# Altium schematic symbol library IC_ADI.SCHLIB: 3169 symbols (part 137 of 181)
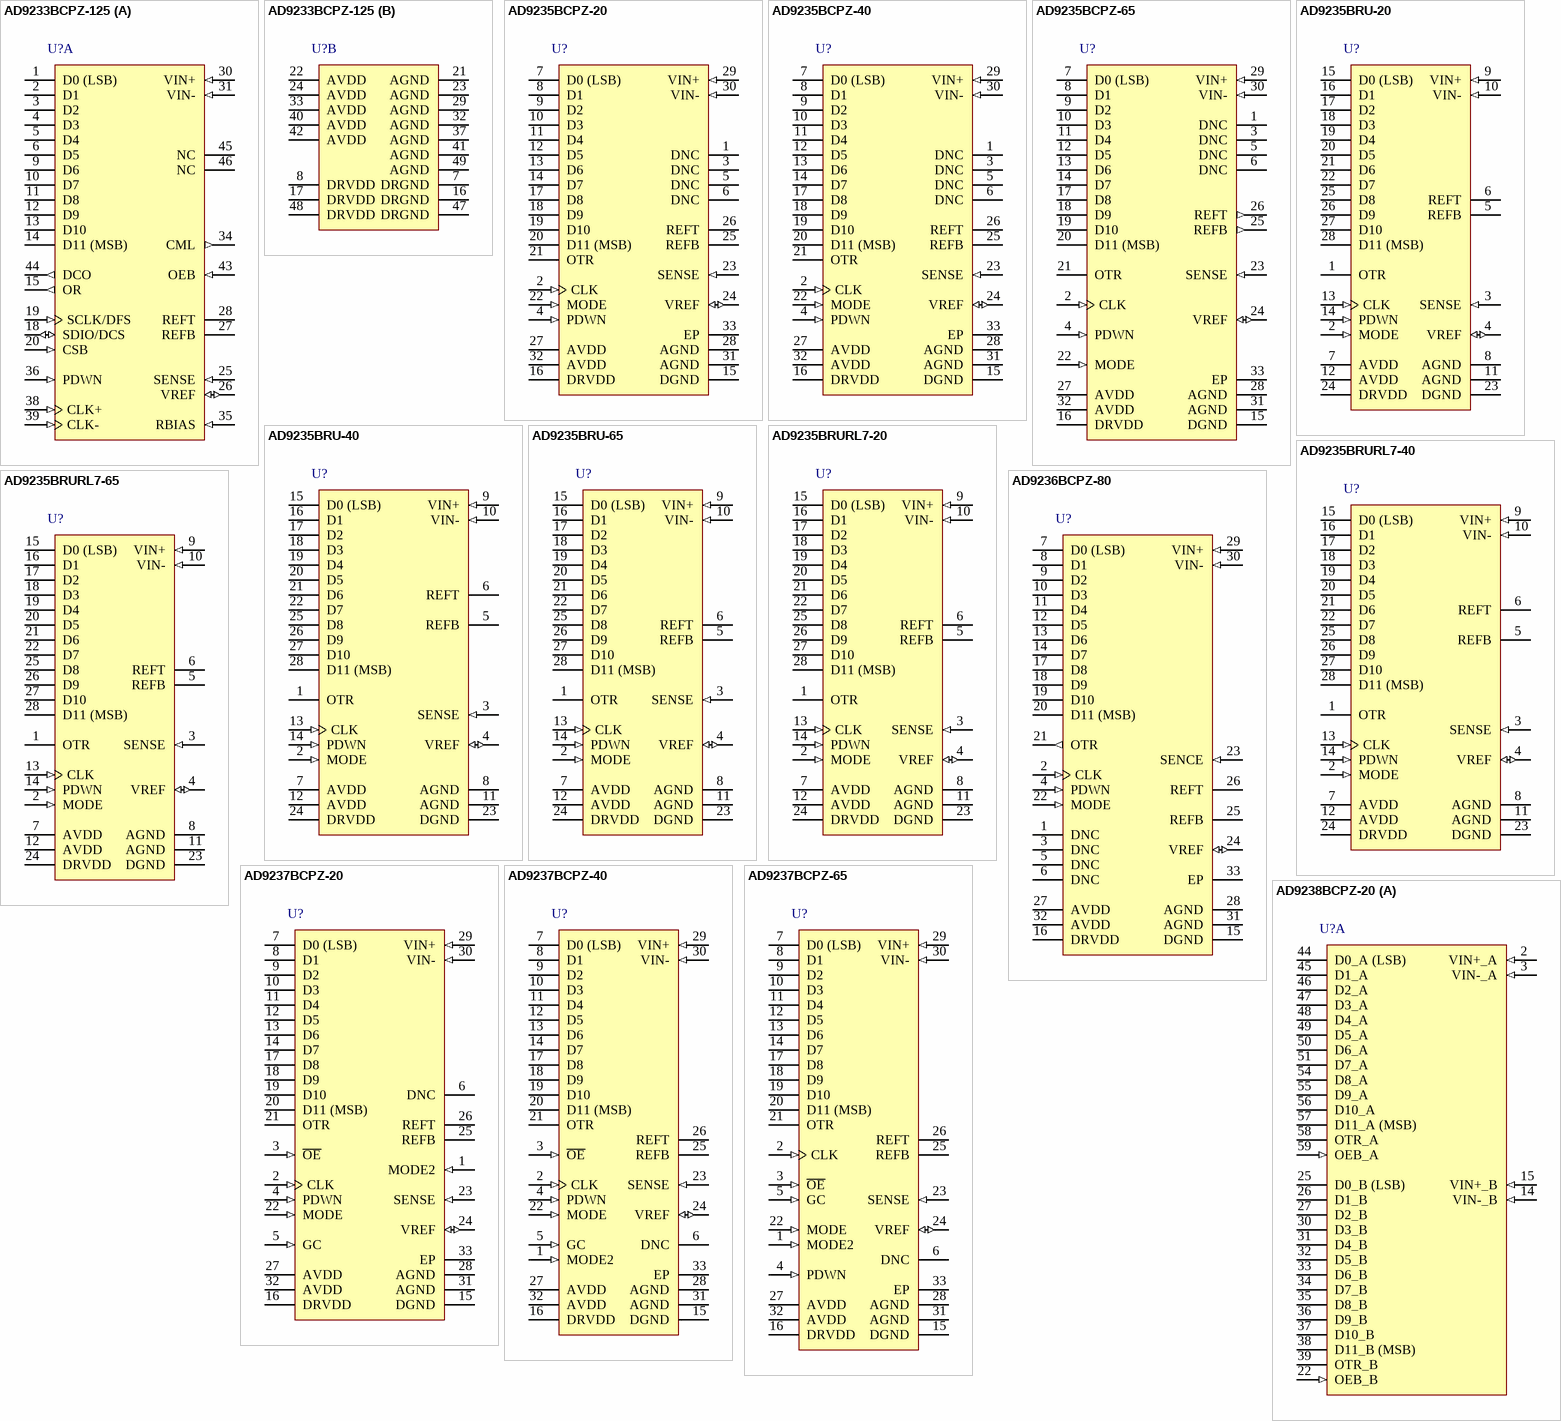
[diagram p327: symbols AD9233BCPZ-125 to AD9238BCPZ-20]

## AD9235BRURL7-65
designator U?
Single 12-Bit Analog-to-Digital Converter with Parallel Interface, 65MSPS, -40 to +85 degC, RU-28, Reel; Generic Part Number: AD9235-65; PartNumber: AD9235BRURL7-65; Resolution (Bits): 12; Channels: 1; Throughput Rate (SPS): 65M; Interface: Par; DatasheetVersion: Rev.C; PackageVersion: 2005; PackageReference: RU-28; PackageDescription: 28-Lead Thin Shrink Small Outline Package [TSSOP]; Supplier Part Number 1: AD9235BRURL7-65-ND; RoHS: N; Packing: Reel; Mounting Technology: Surface Mount; Code_JEDEC: MO-153-AE; ComponentLink1Description: Manufacturer URL; ComponentLink2Description: Datasheet; ComponentLink3Description: Package Specification; ComponentLink4Description: Product URL
footprint TSSOP28_0.65 (Footprint not found)
pins: 1 OTR (hiz) "Out-of-Range Indicator.", 2 MODE (in) "Data Format and Clock Duty Cycle Stabilizer (DCS) Mode Selection.", 3 SENSE (in) "Reference Mode Selection.", 4 VREF (io) "Voltage Reference Input/Output.", 5 REFB "Differential Reference (-).", 6 REFT "Differential Reference (+).", 7 AVDD (power) "Analog Power Supply.", 8 AGND (power) "Analog Ground.", 9 VIN+ (in) "Analog Input Pin (+).", 10 VIN- (in) "Analog Input Pin (-).", 11 AGND (power) "Analog Ground.", 12 AVDD (power) "Analog Power Supply.", 13 CLK (in) "Clock Input Pin.", 14 PDWN (in) "Power-Down Function Selection (Active High).", 15 D0 (LSB) (hiz) "Data Output Bits.", 16 D1 (hiz) "Data Output Bits.", 17 D2 (hiz) "Data Output Bits.", 18 D3 (hiz) "Data Output Bits.", 19 D4 (hiz) "Data Output Bits.", 20 D5 (hiz) "Data Output Bits.", 21 D6 (hiz) "Data Output Bits.", 22 D7 (hiz) "Data Output Bits.", 23 DGND (power) "Digital Output Ground.", 24 DRVDD (power) "Digital Output Driver Supply. Must be decoupled to DGND with a minimum. 0.1 uF capacitor. Recommended decoupling is 0.1 uF in parallel with 10 uF.", 25 D8 (hiz) "Data Output Bits.", 26 D9 (hiz) "Data Output Bits.", 27 D10 (hiz) "Data Output Bits.", 28 D11 (MSB) (hiz) "Data Output Bits."

## AD9236BCPZ-80
designator U?
Single 12-Bit Analog-to-Digital Converter with Parallel Interface, 80MSPS, -40 to +85 degC, CP-32-2, Pb-Free,Tray; Generic Part Number: AD9236; PartNumber: AD9236BCPZ-80; Resolution (Bits): 12; Channels: 1; Throughput Rate (SPS): 80M; Interface: Par; DatasheetVersion: Rev.B; PackageVersion: Jan-2005; PackageReference: CP-32-2; PackageDescription: 32-Lead Lead Frame Chip Scale Package [LFCSP_VQ] 5 x 5 mm Body, Very Thin Quad; Supplier Part Number 1: AD9236BCPZ-80-ND; Supplier Part Number 2: 584-AD9236BCPZ-80; RoHS: Y; Packing: Tray; Mounting Technology: Surface Mount; Code_JEDEC: MO-220-VHHD-2; ComponentLink1Description: Manufacturer URL; ComponentLink2Description: Datasheet; ComponentLink3Description: Package Specification; ComponentLink4Description: Product URL
footprint QFN32_0.5-PAD(5X5) (Footprint not found)
pins: 1 DNC "Do Not Connect", 2 CLK (in) "Clock Input Pin", 3 DNC "Do Not Connect", 4 PDWN (in) "Power-Down Function Select", 5 DNC "Do Not Connect", 6 DNC "Do Not Connect", 7 D0 (LSB) (hiz) "Data Output Bits", 8 D1 (hiz) "Data Output Bits", 9 D2 (hiz) "Data Output Bits", 10 D3 (hiz) "Data Output Bits", 11 D4 (hiz) "Data Output Bits", 12 D5 (hiz) "Data Output Bits", 13 D6 (hiz) "Data Output Bits", 14 D7 (hiz) "Data Output Bits", 15 DGND (power) "Digital Output Ground", 16 DRVDD (power) "Digital Output Driver Supply", 17 D8 (hiz) "Data Output Bits", 18 D9 (hiz) "Data Output Bits", 19 D10 (hiz) "Data Output Bits", 20 D11 (MSB) (hiz) "Data Output Bits", 21 OTR (out) "Out-of-Range Indicator", 22 MODE (in) "Data Format Select and DCS Mode Selection", 23 SENCE (in) "Reference Mode Selection", 24 VREF (io) "Voltage Reference Input/Output", 25 REFB "Differential Reference (-)", 26 REFT "Differential Reference (+)", 27 AVDD (power) "Analog Power Supply", 28 AGND (power) "Analog Ground", 29 VIN+ (in) "Analog Input Pin (+)", 30 VIN- (in) "Analog Input Pin (-)", 31 AGND (power) "Analog Ground", 32 AVDD (power) "Analog Power Supply", 33 EP "Exposed pad"

## AD9237BCPZ-20
designator U?
Single 12-Bit Low Power Analog-to-Digital Converter with Parallel Interface, 20MSPS, 0 to +70 degC, CP-32-2, Pb-Free, Tray; Generic Part Number: AD9237-20; PartNumber: AD9237BCPZ-20; Resolution (Bits): 12; Channels: 1; Throughput Rate (SPS): 20M; Interface: Par; DatasheetVersion: Rev.A; PackageVersion: Jan-2005; PackageReference: CP-32-2; PackageDescription: 32-Lead Lead Frame Chip Scale Package [LFCSP_VQ] 5 x 5 mm Body, Very Thin Quad; Supplier Part Number 1: AD9237BCPZ-20-ND; Supplier Part Number 2: 1078250; Supplier Part Number 3: 59K7200; RoHS: Y; Packing: Tray; Mounting Technology: Surface Mount; Code_JEDEC: MO-220-VHHD-2; ComponentLink1Description: Manufacturer URL; ComponentLink2Description: Datasheet; ComponentLink3Description: Package Specification; ComponentLink4Description: Product URL
footprint QFN32_0.5-PAD(5X5) (Footprint not found)
pins: 1 MODE2 (in) "SHA Gain Select and Power Scaling Control (see Table 8).", 2 CLK (in) "Clock Input Pin.", 3 ~{OE} (in) "Output Enable Pin (Active Low).", 4 PDWN (in) "Power-Down Function Selection (see Table 9).", 5 GC (in) "Gray Code Control (Active High).", 6 DNC "Do Not Connect.", 7 D0 (LSB) (hiz) "Data Output Bits.", 8 D1 (hiz) "Data Output Bits.", 9 D2 (hiz) "Data Output Bits.", 10 D3 (hiz) "Data Output Bits.", 11 D4 (hiz) "Data Output Bits.", 12 D5 (hiz) "Data Output Bits.", 13 D6 (hiz) "Data Output Bits.", 14 D7 (hiz) "Data Output Bits.", 15 DGND (power) "Digital Output Ground.", 16 DRVDD (power) "Digital Output Driver Supply. Must be decoupled to DGND with a minimum 0.1 uF capacitor. Recommended decoupling is 0.1 uF in parallel with 10 uF.", 17 D8 (hiz) "Data Output Bits.", 18 D9 (hiz) "Data Output Bits.", 19 D10 (hiz) "Data Output Bits.", 20 D11 (MSB) (hiz) "Data Output Bits.", 21 OTR (hiz) "Out-of-Range Indicator.", 22 MODE (in) "Data Format and Clock Duty Cycle Stabilizer (DCS) Mode Selection (see Table 10).", 23 SENSE (in) "Reference Mode Selection (see Table 7).", 24 VREF (io) "Voltage Reference Input/Output (see Table 7).", 25 REFB "Differential Reference (-). Must be decoupled to REFT with a minimum 10 uF capacitor.", 26 REFT "Differential Reference (+).", 27 AVDD (power) "Analog Power Supply. Must be decoupled to AGND with a minimum 0.1 uF capacitor. Recommended decoupling is 0.1 uF in parallel with 10 uF.", 28 AGND (power) "Analog Ground.", 29 VIN+ (in) "Analog Input Pin (+).", 30 VIN- (in) "Analog Input Pin (-).", 31 AGND (power) "Analog Ground.", 32 AVDD (power) "Analog Power Supply. Must be decoupled to AGND with a minimum 0.1 uF capacitor. Recommended decoupling is 0.1 uF in parallel with 10 uF.", 33 EP (power) "It is recommended that the exposed paddle be soldered to the ground plane. There is an increased reliability of the solder joints and maximum thermal capability of the package is achieved with exposed paddle soldered to the (See Datasheet)"

## AD9237BCPZ-40
designator U?
Single 12-Bit Low Power Analog-to-Digital Converter with Parallel Interface, 40MSPS, 0 to +70 degC, CP-32-2, Pb-Free, Tray; Generic Part Number: AD9237-40; PartNumber: AD9237BCPZ-40; Resolution (Bits): 12; Channels: 1; Throughput Rate (SPS): 40M; Interface: Par; DatasheetVersion: Rev.A; PackageVersion: Jan-2005; PackageReference: CP-32-2; PackageDescription: 32-Lead Lead Frame Chip Scale Package [LFCSP_VQ] 5 x 5 mm Body, Very Thin Quad; Supplier Part Number 1: AD9237BCPZ-40-ND; Supplier Part Number 2: 1078251; Supplier Part Number 3: 59K7201; Supplier Part Number 4: 584-AD9237BCPZ-40; RoHS: Y; Packing: Tray; Mounting Technology: Surface Mount; Code_JEDEC: MO-220-VHHD-2; ComponentLink1Description: Manufacturer URL; ComponentLink2Description: Datasheet; ComponentLink3Description: Package Specification; ComponentLink4Description: Product URL
footprint QFN32_0.5-PAD(5X5) (Footprint not found)
pins: 1 MODE2 (in) "SHA Gain Select and Power Scaling Control (see Table 8).", 2 CLK (in) "Clock Input Pin.", 3 ~{OE} (in) "Output Enable Pin (Active Low).", 4 PDWN (in) "Power-Down Function Selection (see Table 9).", 5 GC (in) "Gray Code Control (Active High).", 6 DNC "Do Not Connect.", 7 D0 (LSB) (hiz) "Data Output Bits.", 8 D1 (hiz) "Data Output Bits.", 9 D2 (hiz) "Data Output Bits.", 10 D3 (hiz) "Data Output Bits.", 11 D4 (hiz) "Data Output Bits.", 12 D5 (hiz) "Data Output Bits.", 13 D6 (hiz) "Data Output Bits.", 14 D7 (hiz) "Data Output Bits.", 15 DGND (power) "Digital Output Ground.", 16 DRVDD (power) "Digital Output Driver Supply. Must be decoupled to DGND with a minimum 0.1 uF capacitor. Recommended decoupling is 0.1 uF in parallel with 10 uF.", 17 D8 (hiz) "Data Output Bits.", 18 D9 (hiz) "Data Output Bits.", 19 D10 (hiz) "Data Output Bits.", 20 D11 (MSB) (hiz) "Data Output Bits.", 21 OTR (hiz) "Out-of-Range Indicator.", 22 MODE (in) "Data Format and Clock Duty Cycle Stabilizer (DCS) Mode Selection (see Table 10).", 23 SENSE (in) "Reference Mode Selection (see Table 7).", 24 VREF (io) "Voltage Reference Input/Output (see Table 7).", 25 REFB "Differential Reference (-). Must be decoupled to REFT with a minimum 10 uF capacitor.", 26 REFT "Differential Reference (+).", 27 AVDD (power) "Analog Power Supply. Must be decoupled to AGND with a minimum 0.1 uF capacitor. Recommended decoupling is 0.1 uF in parallel with 10 uF.", 28 AGND (power) "Analog Ground.", 29 VIN+ (in) "Analog Input Pin (+).", 30 VIN- (in) "Analog Input Pin (-).", 31 AGND (power) "Analog Ground.", 32 AVDD (power) "Analog Power Supply. Must be decoupled to AGND with a minimum 0.1 uF capacitor. Recommended decoupling is 0.1 uF in parallel with 10 uF.", 33 EP (power) "It is recommended that the exposed paddle be soldered to the ground plane. There is an increased reliability of the solder joints and maximum thermal capability of the package is achieved with exposed paddle soldered to the (See Datasheet)"

## AD9237BCPZ-65
designator U?
Single 12-Bit Low Power Analog-to-Digital Converter with Parallel Interface, 65MSPS, -40 to +85 degC, CP-32-2, Pb-Free, Tray; Generic Part Number: AD9237-65; PartNumber: AD9237BCPZ-65; Resolution (Bits): 12; Channels: 1; Throughput Rate (SPS): 65M; Interface: Par; DatasheetVersion: Rev.A; PackageVersion: Jan-2005; PackageReference: CP-32-2; PackageDescription: 32-Lead Lead Frame Chip Scale Package [LFCSP_VQ] 5 x 5 mm Body, Very Thin Quad; Supplier Part Number 1: AD9237BCPZ-65-ND; Supplier Part Number 2: 1078253; Supplier Part Number 3: 31M4631; Supplier Part Number 4: 59K7202; RoHS: Y; Packing: Tray; Mounting Technology: Surface Mount; Code_JEDEC: MO-220-VHHD-2; ComponentLink1Description: Manufacturer URL; ComponentLink2Description: Datasheet; ComponentLink3Description: Package Specification; ComponentLink4Description: Product URL
footprint QFN32_0.5-PAD(5X5) (Footprint not found)
pins: 1 MODE2 (in) "SHA Gain Select and Power Scaling Control (see Table 8).", 2 CLK (in) "Clock Input Pin.", 3 ~{OE} (in) "Output Enable Pin (Active Low).", 4 PDWN (in) "Power-Down Function Selection (see Table 9).", 5 GC (in) "Gray Code Control (Active High).", 6 DNC "Do Not Connect.", 7 D0 (LSB) (hiz) "Data Output Bits.", 8 D1 (hiz) "Data Output Bits.", 9 D2 (hiz) "Data Output Bits.", 10 D3 (hiz) "Data Output Bits.", 11 D4 (hiz) "Data Output Bits.", 12 D5 (hiz) "Data Output Bits.", 13 D6 (hiz) "Data Output Bits.", 14 D7 (hiz) "Data Output Bits.", 15 DGND (power) "Digital Output Ground.", 16 DRVDD (power) "Digital Output Driver Supply. Must be decoupled to DGND with a minimum 0.1 uF capacitor. Recommended decoupling is 0.1 uF in parallel with 10 uF.", 17 D8 (hiz) "Data Output Bits.", 18 D9 (hiz) "Data Output Bits.", 19 D10 (hiz) "Data Output Bits.", 20 D11 (MSB) (hiz) "Data Output Bits.", 21 OTR (hiz) "Out-of-Range Indicator.", 22 MODE (in) "Data Format and Clock Duty Cycle Stabilizer (DCS) Mode Selection (see Table 10).", 23 SENSE (in) "Reference Mode Selection (see Table 7).", 24 VREF (io) "Voltage Reference Input/Output (see Table 7).", 25 REFB "Differential Reference (-). Must be decoupled to REFT with a minimum 10 uF capacitor.", 26 REFT "Differential Reference (+).", 27 AVDD (power) "Analog Power Supply. Must be decoupled to AGND with a minimum 0.1 uF capacitor. Recommended decoupling is 0.1 uF in parallel with 10 uF.", 28 AGND (power) "Analog Ground.", 29 VIN+ (in) "Analog Input Pin (+).", 30 VIN- (in) "Analog Input Pin (-).", 31 AGND (power) "Analog Ground.", 32 AVDD (power) "Analog Power Supply. Must be decoupled to AGND with a minimum 0.1 uF capacitor. Recommended decoupling is 0.1 uF in parallel with 10 uF.", 33 EP (power) "It is recommended that the exposed paddle be soldered to the ground plane. There is an increased reliability of the solder joints and maximum thermal capability of the package is achieved with exposed paddle soldered to the (See Datasheet)"

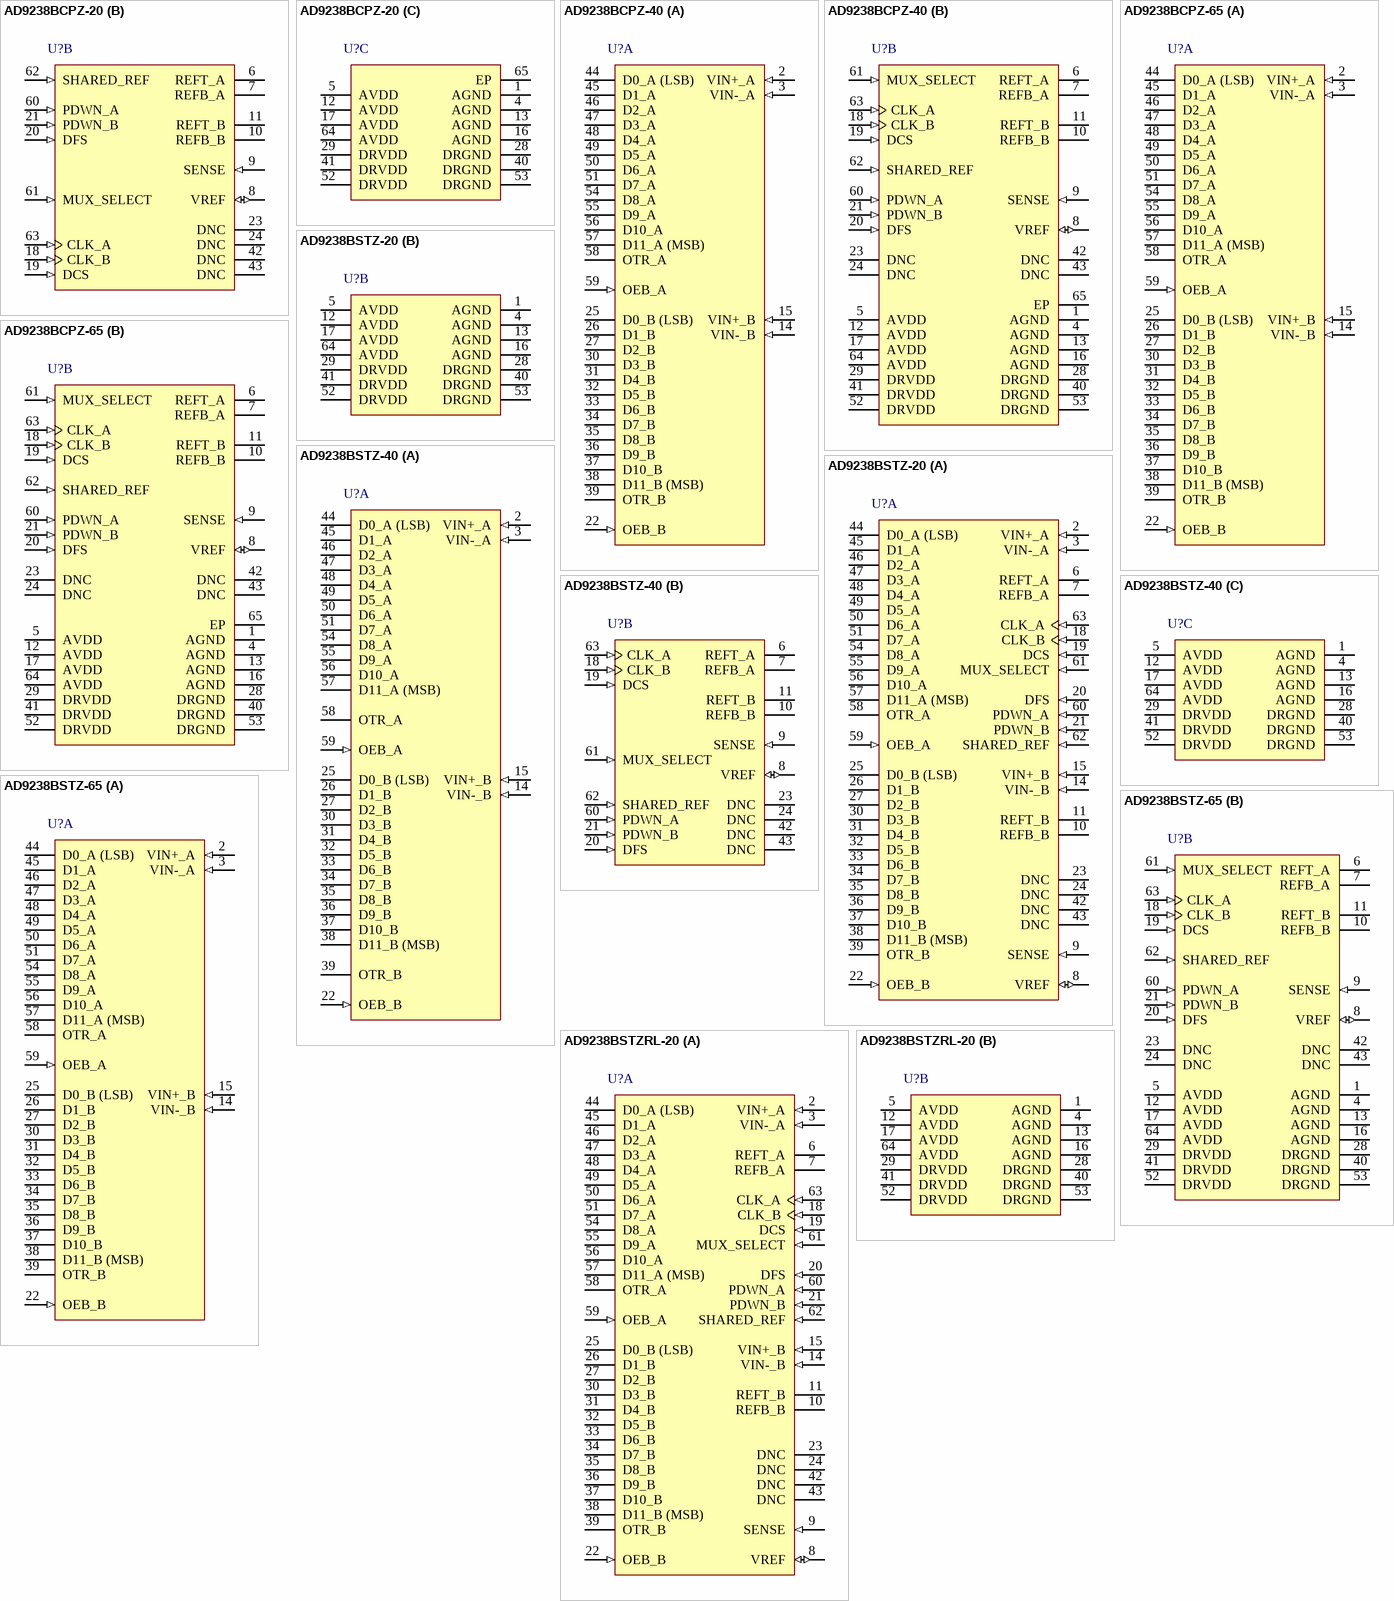
[diagram p112: symbols AD9238BCPZ-20 to AD9238BSTZRL-20]

## AD9238BCPZ-20
designator U?
Dual 12-Bit Analog-to-Digital Converter with Parallel Interface, 20MSPS, -40 to +85 degC, CP-64-1, Pb-Free, Tray; Generic Part Number: AD9238-20; PartNumber: AD9238BCPZ-20; Resolution (Bits): 12; Channels: 2; Throughput Rate (SPS): 20M; Interface: Par; DatasheetVersion: Rev.C; PackageVersion: Aug-2007; PackageReference: CP-64-1; PackageDescription: 64-Lead Lead Frame Chip Scale Package [LFCSP_VQ] 9 x 9 mm Body, Very Thin Quad; Supplier Part Number 1: AD9238BCPZ-20-ND; Supplier Part Number 2: 584-AD9238BCPZ-20; RoHS: Y; Packing: Tray; Mounting Technology: Surface Mount; Code_JEDEC: MO-220-VMMD-4; ComponentLink1Description: Manufacturer URL; ComponentLink2Description: Datasheet; ComponentLink3Description: Package Specification; ComponentLink4Description: Product URL
footprint QFN64_0.5-PAD(9X9) (Footprint not found)
part A pins: 2 VIN+_A (in) "Analog Input Pin (+) for Channel A.", 3 VIN-_A (in) "Analog Input Pin (-) for Channel A.", 14 VIN-_B (in) "Analog Input Pin (-) for Channel B.", 15 VIN+_B (in) "Analog Input Pin (+) for Channel B.", 22 OEB_B (in) "Output Enable Bit for Channel B:  Logic 0 enables Data Bus B.  Logic 1 sets outputs to High-Z.", 25 D0_B (LSB) (hiz) "Channel B Data Output Bits.", 26 D1_B (hiz) "Channel B Data Output Bits.", 27 D2_B (hiz) "Channel B Data Output Bits.", 30 D3_B (hiz) "Channel B Data Output Bits.", 31 D4_B (hiz) "Channel B Data Output Bits.", 32 D5_B (hiz) "Channel B Data Output Bits.", 33 D6_B (hiz) "Channel B Data Output Bits.", 34 D7_B (hiz) "Channel B Data Output Bits.", 35 D8_B (hiz) "Channel B Data Output Bits.", 36 D9_B (hiz) "Channel B Data Output Bits.", 37 D10_B (hiz) "Channel A Data Output Bits.", 38 D11_B (MSB) (hiz) "Channel A Data Output Bits.", 39 OTR_B (hiz) "Out-of-Range Indicator for Channel B.", 44 D0_A (LSB) (hiz) "Channel A Data Output Bits.", 45 D1_A (hiz) "Channel A Data Output Bits.", 46 D2_A (hiz) "Channel A Data Output Bits.", 47 D3_A (hiz) "Channel A Data Output Bits.", 48 D4_A (hiz) "Channel A Data Output Bits.", 49 D5_A (hiz) "Channel A Data Output Bits.", 50 D6_A (hiz) "Channel A Data Output Bits.", 51 D7_A (hiz) "Channel A Data Output Bits.", 54 D8_A (hiz) "Channel A Data Output Bits.", 55 D9_A (hiz) "Channel A Data Output Bits.", 56 D10_A (hiz) "Channel A Data Output Bits.", 57 D11_A (MSB) (hiz) "Channel A Data Output Bits.", 58 OTR_A (hiz) "Out-of-Range Indicator for Channel A.", 59 OEB_A (in) "Output Enable Bit for Channel A:  Logic 0 enables Data Bus A.  Logic 1 sets outputs to High-Z."
part B pins: 6 REFT_A "Differential Reference (+) for Channel A.", 7 REFB_A "Differential Reference (-) for Channel A.", 8 VREF (io) "Voltage Reference Input/Output.", 9 SENSE (in) "Reference Mode Selection.", 10 REFB_B "Differential Reference (-) for Channel B.", 11 REFT_B "Differential Reference (+) for Channel B.", 18 CLK_B (in) "Clock Input Pin for Channel B.", 19 DCS (in) "Enable Duty Cycle Stabilizer (DCS) Mode (Tie High to Enable).", 20 DFS (in) "Data Output Format Select Bit (Low for Offset Binary, High for Twos Complement).", 21 PDWN_B (in) "Power-Down Function Selection for Channel B:  Logic 0 enables Channel B.  Logic 1 powers down Channel B. (Outputs static, not High-Z.)", 23 DNC "Do Not Connect Pins. Should be left floating.", 24 DNC "Do Not Connect Pins. Should be left floating.", 42 DNC "Do Not Connect Pins. Should be left floating.", 43 DNC "Do Not Connect Pins. Should be left floating.", 60 PDWN_A (in) "Power-Down Function Selection for Channel A:  Logic 0 enables Channel A.  Logic 1 powers down Channel A. (Outputs static, not High-Z.)", 61 MUX_SELECT (in) "Data Multiplexed Mode. (See Data Format section for how to enable; high setting disables  output data multiplexed mode).", 62 SHARED_REF (in) "Shared Reference Control Bit (Low for Independent Reference Mode, High for Shared Reference Mode).", 63 CLK_A (in) "Clock Input Pin for Channel A."
part C pins: 1 AGND (power) "Analog Ground.", 4 AGND (power) "Analog Ground.", 5 AVDD (power) "Analog Power Supply.", 12 AVDD (power) "Analog Power Supply.", 13 AGND (power) "Analog Ground.", 16 AGND (power) "Analog Ground.", 17 AVDD (power) "Analog Power Supply.", 28 DRGND (power) "Digital Output Ground.", 29 DRVDD (power) "Digital Output Driver Supply. Must be decoupled to DRGND with a minimum 0.1 uF capacitor.  Recommended decoupling is 0.1 uF capacitor in parallel with 10 uF.", 40 DRGND (power) "Digital Output Ground.", 41 DRVDD (power) "Digital Output Driver Supply. Must be decoupled to DRGND with a minimum 0.1 uF capacitor.  Recommended decoupling is 0.1 uF capacitor in parallel with 10 uF.", 52 DRVDD (power) "Digital Output Driver Supply. Must be decoupled to DRGND with a minimum 0.1 uF capacitor.   Recommended decoupling is 0.1 uF capacitor in parallel with 10 uF.", 53 DRGND (power) "Digital Output Ground.", 64 AVDD (power) "Analog Power Supply.", 65 EP (power) "For the 64-Lead LFCSP only, there is an exposed pad that must connect to AGND."

## AD9238BCPZ-40
designator U?
Dual 12-Bit Analog-to-Digital Converter with Parallel Interface, 40MSPS, -40 to +85 degC, CP-64-1, Pb-Free, Tray; Generic Part Number: AD9238-40; PartNumber: AD9238BCPZ-40; Resolution (Bits): 12; Channels: 2; Throughput Rate (SPS): 40M; Interface: Par; DatasheetVersion: Rev.C; PackageVersion: Aug-2007; PackageReference: CP-64-1; PackageDescription: 64-Lead Lead Frame Chip Scale Package [LFCSP_VQ] 9 x 9 mm Body, Very Thin Quad; Supplier Part Number 1: AD9238BCPZ-40-ND; Supplier Part Number 2: 584-AD9238BCPZ-40; RoHS: Y; Packing: Tray; Mounting Technology: Surface Mount; Code_JEDEC: MO-220-VMMD-4; ComponentLink1Description: Manufacturer URL; ComponentLink2Description: Datasheet; ComponentLink3Description: Package Specification; ComponentLink4Description: Product URL
footprint QFN64_0.5-PAD(9X9) (Footprint not found)
part A pins: 2 VIN+_A (in) "Analog Input Pin (+) for Channel A.", 3 VIN-_A (in) "Analog Input Pin (-) for Channel A.", 14 VIN-_B (in) "Analog Input Pin (-) for Channel B.", 15 VIN+_B (in) "Analog Input Pin (+) for Channel B.", 22 OEB_B (in) "Output Enable Bit for Channel B:  Logic 0 enables Data Bus B.  Logic 1 sets outputs to High-Z.", 25 D0_B (LSB) (hiz) "Channel B Data Output Bits.", 26 D1_B (hiz) "Channel B Data Output Bits.", 27 D2_B (hiz) "Channel B Data Output Bits.", 30 D3_B (hiz) "Channel B Data Output Bits.", 31 D4_B (hiz) "Channel B Data Output Bits.", 32 D5_B (hiz) "Channel B Data Output Bits.", 33 D6_B (hiz) "Channel B Data Output Bits.", 34 D7_B (hiz) "Channel B Data Output Bits.", 35 D8_B (hiz) "Channel B Data Output Bits.", 36 D9_B (hiz) "Channel B Data Output Bits.", 37 D10_B (hiz) "Channel A Data Output Bits.", 38 D11_B (MSB) (hiz) "Channel A Data Output Bits.", 39 OTR_B (hiz) "Out-of-Range Indicator for Channel B.", 44 D0_A (LSB) (hiz) "Channel A Data Output Bits.", 45 D1_A (hiz) "Channel A Data Output Bits.", 46 D2_A (hiz) "Channel A Data Output Bits.", 47 D3_A (hiz) "Channel A Data Output Bits.", 48 D4_A (hiz) "Channel A Data Output Bits.", 49 D5_A (hiz) "Channel A Data Output Bits.", 50 D6_A (hiz) "Channel A Data Output Bits.", 51 D7_A (hiz) "Channel A Data Output Bits.", 54 D8_A (hiz) "Channel A Data Output Bits.", 55 D9_A (hiz) "Channel A Data Output Bits.", 56 D10_A (hiz) "Channel A Data Output Bits.", 57 D11_A (MSB) (hiz) "Channel A Data Output Bits.", 58 OTR_A (hiz) "Out-of-Range Indicator for Channel A.", 59 OEB_A (in) "Output Enable Bit for Channel A:  Logic 0 enables Data Bus A.  Logic 1 sets outputs to High-Z."
part B pins: 1 AGND (power) "Analog Ground.", 4 AGND (power) "Analog Ground.", 5 AVDD (power) "Analog Power Supply.", 6 REFT_A "Differential Reference (+) for Channel A.", 7 REFB_A "Differential Reference (-) for Channel A.", 8 VREF (io) "Voltage Reference Input/Output.", 9 SENSE (in) "Reference Mode Selection.", 10 REFB_B "Differential Reference (-) for Channel B.", 11 REFT_B "Differential Reference (+) for Channel B.", 12 AVDD (power) "Analog Power Supply.", 13 AGND (power) "Analog Ground.", 16 AGND (power) "Analog Ground.", 17 AVDD (power) "Analog Power Supply.", 18 CLK_B (in) "Clock Input Pin for Channel B.", 19 DCS (in) "Enable Duty Cycle Stabilizer (DCS) Mode (Tie High to Enable).", 20 DFS (in) "Data Output Format Select Bit (Low for Offset Binary, High for Twos Complement).", 21 PDWN_B (in) "Power-Down Function Selection for Channel B:  Logic 0 enables Channel B.  Logic 1 powers down Channel B. (Outputs static, not High-Z.)", 23 DNC "Do Not Connect Pins. Should be left floating.", 24 DNC "Do Not Connect Pins. Should be left floating.", 28 DRGND (power) "Digital Output Ground.", 29 DRVDD (power) "Digital Output Driver Supply. Must be decoupled to DRGND with a minimum 0.1 礔 capacitor.  Recommended decoupling is 0.1 礔 capacitor in parallel with 10 礔.", 40 DRGND (power) "Digital Output Ground.", 41 DRVDD (power) "Digital Output Driver Supply. Must be decoupled to DRGND with a minimum 0.1 礔 capacitor.  Recommended decoupling is 0.1 礔 capacitor in parallel with 10 礔.", 42 DNC "Do Not Connect Pins. Should be left floating.", 43 DNC "Do Not Connect Pins. Should be left floating.", 52 DRVDD (power) "Digital Output Driver Supply. Must be decoupled to DRGND with a minimum 0.1 礔 capacitor.   Recommended decoupling is 0.1 礔 capacitor in parallel with 10 礔.", 53 DRGND (power) "Digital Output Ground.", 60 PDWN_A (in) "Power-Down Function Selection for Channel A:  Logic 0 enables Channel A.  Logic 1 powers down Channel A. (Outputs static, not High-Z.)", 61 MUX_SELECT (in) "Data Multiplexed Mode. (See Data Format section for how to enable; high setting disables  output data multiplexed mode).", 62 SHARED_REF (in) "Shared Reference Control Bit (Low for Independent Reference Mode, High for Shared Reference Mode).", 63 CLK_A (in) "Clock Input Pin for Channel A.", 64 AVDD (power) "Analog Power Supply.", 65 EP (power) "For the 64-Lead LFCSP only, there is an exposed pad that must connect to AGND."

## AD9238BCPZ-65
designator U?
Dual 12-Bit Analog-to-Digital Converter with Parallel Interface, 65MSPS, -40 to +85 degC, CP-64-1, Pb-Free, Tray; Generic Part Number: AD9238-65; PartNumber: AD9238BCPZ-65; Resolution (Bits): 12; Channels: 2; Throughput Rate (SPS): 65M; Interface: Par; DatasheetVersion: Rev.C; PackageVersion: Aug-2007; PackageReference: CP-64-1; PackageDescription: 64-Lead Lead Frame Chip Scale Package [LFCSP_VQ] 9 x 9 mm Body, Very Thin Quad; Supplier Part Number 1: AD9238BCPZ-65-ND; Supplier Part Number 2: 584-AD9238BCPZ-65; RoHS: Y; Packing: Tray; Mounting Technology: Surface Mount; Code_JEDEC: MO-220-VMMD-4; ComponentLink1Description: Manufacturer URL; ComponentLink2Description: Datasheet; ComponentLink3Description: Package Specification; ComponentLink4Description: Product URL
footprint QFN64_0.5-PAD(9X9) (Footprint not found)
part A pins: 2 VIN+_A (in) "Analog Input Pin (+) for Channel A.", 3 VIN-_A (in) "Analog Input Pin (-) for Channel A.", 14 VIN-_B (in) "Analog Input Pin (-) for Channel B.", 15 VIN+_B (in) "Analog Input Pin (+) for Channel B.", 22 OEB_B (in) "Output Enable Bit for Channel B:  Logic 0 enables Data Bus B.  Logic 1 sets outputs to High-Z.", 25 D0_B (LSB) (hiz) "Channel B Data Output Bits.", 26 D1_B (hiz) "Channel B Data Output Bits.", 27 D2_B (hiz) "Channel B Data Output Bits.", 30 D3_B (hiz) "Channel B Data Output Bits.", 31 D4_B (hiz) "Channel B Data Output Bits.", 32 D5_B (hiz) "Channel B Data Output Bits.", 33 D6_B (hiz) "Channel B Data Output Bits.", 34 D7_B (hiz) "Channel B Data Output Bits.", 35 D8_B (hiz) "Channel B Data Output Bits.", 36 D9_B (hiz) "Channel B Data Output Bits.", 37 D10_B (hiz) "Channel A Data Output Bits.", 38 D11_B (MSB) (hiz) "Channel A Data Output Bits.", 39 OTR_B (hiz) "Out-of-Range Indicator for Channel B.", 44 D0_A (LSB) (hiz) "Channel A Data Output Bits.", 45 D1_A (hiz) "Channel A Data Output Bits.", 46 D2_A (hiz) "Channel A Data Output Bits.", 47 D3_A (hiz) "Channel A Data Output Bits.", 48 D4_A (hiz) "Channel A Data Output Bits.", 49 D5_A (hiz) "Channel A Data Output Bits.", 50 D6_A (hiz) "Channel A Data Output Bits.", 51 D7_A (hiz) "Channel A Data Output Bits.", 54 D8_A (hiz) "Channel A Data Output Bits.", 55 D9_A (hiz) "Channel A Data Output Bits.", 56 D10_A (hiz) "Channel A Data Output Bits.", 57 D11_A (MSB) (hiz) "Channel A Data Output Bits.", 58 OTR_A (hiz) "Out-of-Range Indicator for Channel A.", 59 OEB_A (in) "Output Enable Bit for Channel A:  Logic 0 enables Data Bus A.  Logic 1 sets outputs to High-Z."
part B pins: 1 AGND (power) "Analog Ground.", 4 AGND (power) "Analog Ground.", 5 AVDD (power) "Analog Power Supply.", 6 REFT_A "Differential Reference (+) for Channel A.", 7 REFB_A "Differential Reference (-) for Channel A.", 8 VREF (io) "Voltage Reference Input/Output.", 9 SENSE (in) "Reference Mode Selection.", 10 REFB_B "Differential Reference (-) for Channel B.", 11 REFT_B "Differential Reference (+) for Channel B.", 12 AVDD (power) "Analog Power Supply.", 13 AGND (power) "Analog Ground.", 16 AGND (power) "Analog Ground.", 17 AVDD (power) "Analog Power Supply.", 18 CLK_B (in) "Clock Input Pin for Channel B.", 19 DCS (in) "Enable Duty Cycle Stabilizer (DCS) Mode (Tie High to Enable).", 20 DFS (in) "Data Output Format Select Bit (Low for Offset Binary, High for Twos Complement).", 21 PDWN_B (in) "Power-Down Function Selection for Channel B:  Logic 0 enables Channel B.  Logic 1 powers down Channel B. (Outputs static, not High-Z.)", 23 DNC "Do Not Connect Pins. Should be left floating.", 24 DNC "Do Not Connect Pins. Should be left floating.", 28 DRGND (power) "Digital Output Ground.", 29 DRVDD (power) "Digital Output Driver Supply. Must be decoupled to DRGND with a minimum 0.1 礔 capacitor.  Recommended decoupling is 0.1 礔 capacitor in parallel with 10 礔.", 40 DRGND (power) "Digital Output Ground.", 41 DRVDD (power) "Digital Output Driver Supply. Must be decoupled to DRGND with a minimum 0.1 礔 capacitor.  Recommended decoupling is 0.1 礔 capacitor in parallel with 10 礔.", 42 DNC "Do Not Connect Pins. Should be left floating.", 43 DNC "Do Not Connect Pins. Should be left floating.", 52 DRVDD (power) "Digital Output Driver Supply. Must be decoupled to DRGND with a minimum 0.1 礔 capacitor.   Recommended decoupling is 0.1 礔 capacitor in parallel with 10 礔.", 53 DRGND (power) "Digital Output Ground.", 60 PDWN_A (in) "Power-Down Function Selection for Channel A:  Logic 0 enables Channel A.  Logic 1 powers down Channel A. (Outputs static, not High-Z.)", 61 MUX_SELECT (in) "Data Multiplexed Mode. (See Data Format section for how to enable; high setting disables  output data multiplexed mode).", 62 SHARED_REF (in) "Shared Reference Control Bit (Low for Independent Reference Mode, High for Shared Reference Mode).", 63 CLK_A (in) "Clock Input Pin for Channel A.", 64 AVDD (power) "Analog Power Supply.", 65 EP (power) "For the 64-Lead LFCSP only, there is an exposed pad that must connect to AGND."